# Altium footprint library My Library.PCBLIB: 198 footprints (part 4 of 13)
Each footprint in its own frame and in the unit in brackets; x right, y up, seen from the top. Pads: shape width x height; smd on the part's side, far side on the other; paste and mask are expansions set on the pad; w line width, h text height; cw(c..) or ccw(c..) is an arc to the next point about the centre after c.
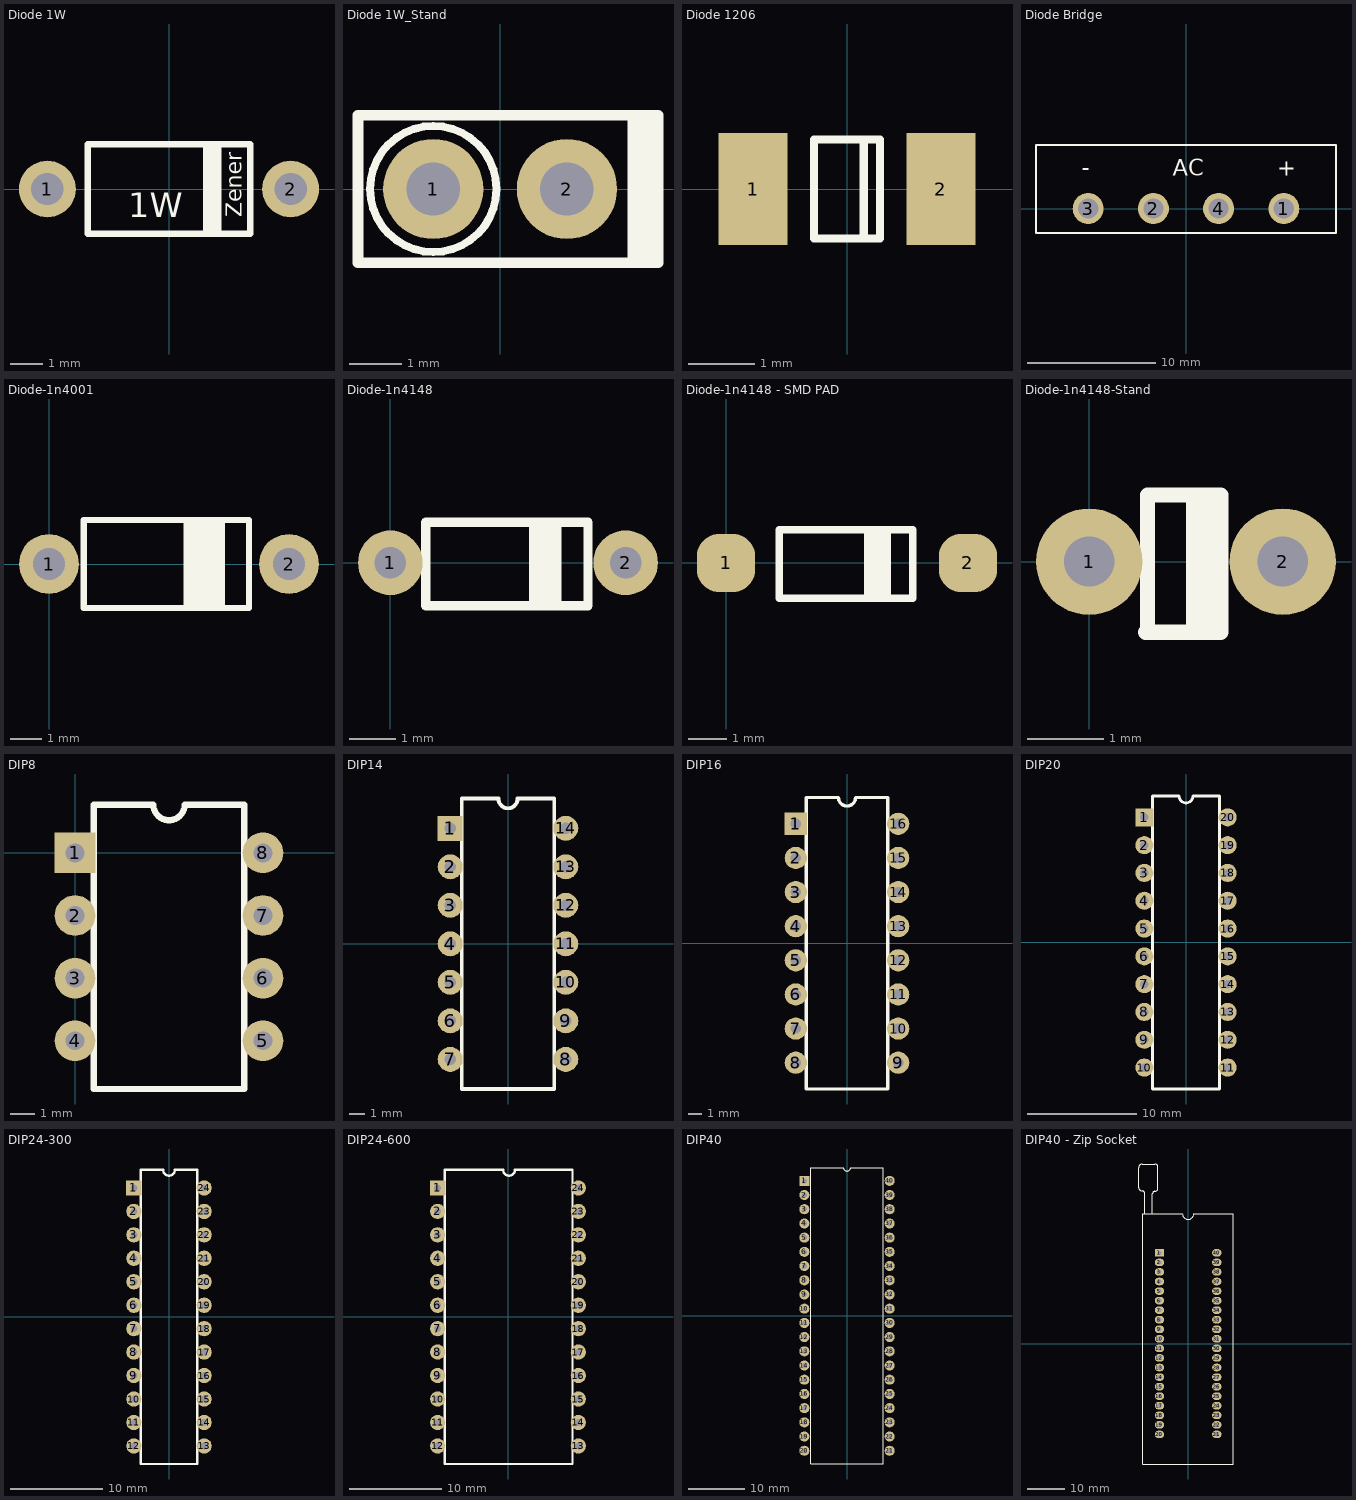
[diagram p3: the footprints below, top view; thin cyan lines are the x and y axes]

## Diode 1W [mil]
height 122.05
pads (2):
  round 70 hole 40: 1(-150,0) 2(150,0)
Top Overlay:
  rectangle: 42,-55 65,55
  lines w7.87: -100,-55 -100,55 100,55 100,-55 -100,-55
  text "1W" at -50,-35 h30
  text "Zener" at 90,-35 h19.68
3D body "Zener 1W.STEP": height 131.24, standoff -39.37, extent -166,-52.5 165,52.5

## Diode 1W_Stand [mil]
pads (2):
  round 75 hole 40: 1(-50,0) 2(50,0)
Top Overlay:
  circle w5.91: c-50,0 r47.24
  rectangle: 95.47,-55 118.11,55
  lines w7.87: -106.3,-55 118.11,-55 118.11,55 -106.3,55 -106.3,-55
3D body "Zener 1W_Stand.STEP": height 291.09, standoff -39.37, extent -103,-52 65,53

## Diode 1206 [mm]
pads (2):
  rect 1.05x1.7 smd: 1(-1.425,0) 2(1.425,0)
Top Overlay:
  lines w0.127: 0.254,-0.75 0.254,0.75 ; -0.5,-0.75 -0.5,0.75 0.5,0.75 0.5,-0.75 -0.5,-0.75

## Diode Bridge [mil]
pads (4):
  round 95 hole 62: 1(300,0) 2(-100,0) 3(-300,0) 4(100,0)
Top Overlay:
  lines w7: -460,-75 460,-75 460,195 -460,195 -460,-75
  text "AC" at -40,100 h50
  text "-" at -320,100 h50
  text "+" at 280,100 h50
3D body "KBU8M.STEP": height 759.84, standoff -157.48, extent -455,-75 458.39,195.08

## Diode-1n4001 [mil]
pads (2):
  round 75 hole 40: 1(0,0) 2(300,0)
Top Overlay:
  rectangle: 167.83,-59.06 220,59.06
  lines w7.87: 43.31,-55 250,-55 250,55 43.31,55 43.31,-55
3D body "1N4007.STEP": height 131.24, standoff -39.37, extent -16,-52.5 315,52.5

## Diode-1n4148 [mil]
pads (2):
  round 55 hole 27: 1(0,0) 2(200,0)
Top Overlay:
  rectangle: 117.72,-36.5 145.28,34.37
  lines w7.87: 30.12,-36.5 30.12,34.37 167.91,34.37 167.91,-36.5 30.12,-36.5
3D body "1N4148.STEP": height 71.22, standoff -40, extent -6.5,-31.96 210.5,33

## Diode-1n4148 - SMD PAD [mil]
pads (2):
  rrect75% 60x60 smd: 1(0,0) 2(250,0)
Top Overlay:
  rectangle: 142.72,-36.5 170.28,34.37
  lines w7.87: 55.12,-36.5 55.12,34.37 192.91,34.37 192.91,-36.5 55.12,-36.5
3D body "1N4148.STEP": height 111.22, standoff 0, extent 16.5,-29.96 233.5,35

## Diode-1n4148-Stand [mil]
pads (2):
  round 55 hole 26: 1(0,0) 2(100,0)
Top Overlay:
  rectangle: 50,-36.87 66,34
  lines w7.87: 29.12,-36.5 67,-36.5 ; 30.12,-36.5 30.12,34.37 68,34.37 68,-36.5
3D body "1N4148_Stand_V2008.STEP": height 216.61, standoff -40, extent -32,-32 108.98,32.96

## DIP8 [mil]
pads (8):
  rect 65x65 hole 30: 1(0,0)
  round 65 hole 30: 2(0,-100) 3(0,-200) 4(0,-300) 5(300,-300) 6(300,-200) 7(300,-100) 8(300,0)
Top Overlay:
  lines w10: 30,-377 270,-377 270,77 175,77 cw(c150,77) 125,77 30,77 30,-377
3D body "SW3DPS-DIP8-DEFAULT.step": height 165, standoff -105, extent -5,-375 305,75

## DIP14 [mil]
pads (14):
  rect 65x65 hole 30: 1(-150,300)
  round 65 hole 30: 2(-150,200) 3(-150,100) 4(-150,0) 5(-150,-100) 6(-150,-200) 7(-150,-300) 8(150,-300) 9(150,-200) 10(150,-100) 11(150,0) 12(150,100) 13(150,200) 14(150,300)
Top Overlay:
  lines w10: -120,-377 -120,377 -25,377 ccw(c0,377) 25,377 120,377 120,-377 -120,-377
3D body "SW3dPS-DIP14-300.step": height 200, standoff -98.03, extent -154.92,-383.86 154.92,383.86

## DIP16 [mil]
pads (16):
  rect 65x65 hole 30: 1(-150,350)
  round 65 hole 30: 2(-150,250) 3(-150,150) 4(-150,50) 5(-150,-50) 6(-150,-150) 7(-150,-250) 8(-150,-350) 9(150,-350) 10(150,-250) 11(150,-150) 12(150,-50) 13(150,50) 14(150,150) 15(150,250) 16(150,350)
Top Overlay:
  lines w10: -120,-427 120,-427 120,427 25,427 cw(c0,427) -25,427 -120,427 -120,-427
3D body "SW3dPS-DIP16-300.step": height 200, standoff -98.03, extent -154.92,-393.7 154.92,393.7

## DIP20 [mil]
pads (20):
  rect 65x65 hole 30: 1(-150,450)
  round 65 hole 30: 2(-150,350) 3(-150,250) 4(-150,150) 5(-150,50) 6(-150,-50) 7(-150,-150) 8(-150,-250) 9(-150,-350) 10(-150,-450) 11(150,-450) 12(150,-350) 13(150,-250) 14(150,-150) 15(150,-50) 16(150,50) 17(150,150) 18(150,250) 19(150,350) 20(150,450)
Top Overlay:
  lines w10: -120,-527 -120,527 -25,527 ccw(c0,527) 25,527 120,527 120,-527 -120,-527
Mechanical 1:
  drawing of 264 lines, arcs and shapes, not listed
3D body: height 101, standoff 100, extent -25.5,501.6 25.5,532.1
3D body: height 35, standoff -75, extent 145,-359 155,-341
3D body: height 75, standoff 35, extent 145,-375 155,-325
3D body: height 75, standoff 65, extent 125,-375 145,-325
3D body: height 35, standoff -75, extent 145,-459 155,-441
3D body: height 75, standoff 35, extent 145,-475 155,-425
3D body: height 75, standoff 65, extent 125,-475 145,-425
3D body: height 35, standoff -75, extent -155,-459 -145,-441
3D body: height 75, standoff 35, extent -155,-475 -145,-425
3D body: height 75, standoff 65, extent -145,-475 -125,-425
3D body: height 35, standoff -75, extent -155,-359 -145,-341
3D body: height 75, standoff 35, extent -155,-375 -145,-325
3D body: height 75, standoff 65, extent -145,-375 -125,-325
3D body: height 75, standoff 65, extent 124,-275 144,-225
3D body: height 75, standoff 35, extent 144,-275 154,-225
3D body: height 35, standoff -75, extent 144,-259 154,-241
3D body: height 75, standoff 65, extent -145,-275 -125,-225
3D body: height 75, standoff 35, extent -155,-275 -145,-225
3D body: height 35, standoff -75, extent -155,-259 -145,-241
3D body: height 35, standoff -75, extent 145,441 155,459
3D body: height 75, standoff 35, extent 145,425 155,475
3D body: height 75, standoff 65, extent 125,425 145,475
3D body: height 35, standoff -75, extent 145,341 155,359
3D body: height 75, standoff 35, extent 145,325 155,375
3D body: height 75, standoff 65, extent 125,325 145,375
3D body: height 35, standoff -75, extent 145,241 155,259
3D body: height 75, standoff 35, extent 145,225 155,275
3D body: height 75, standoff 65, extent 125,225 145,275
3D body: height 35, standoff -75, extent 145,141 155,159
3D body: height 75, standoff 35, extent 145,125 155,175
3D body: height 75, standoff 65, extent 125,125 145,175
3D body: height 35, standoff -75, extent 145,41 155,59
3D body: height 75, standoff 35, extent 145,25 155,75
3D body: height 75, standoff 65, extent 125,25 145,75
3D body: height 35, standoff -75, extent 145,-59 155,-41
3D body: height 75, standoff 35, extent 145,-75 155,-25
3D body: height 75, standoff 65, extent 125,-75 145,-25
3D body: height 35, standoff -75, extent 145,-159 155,-141
3D body: height 75, standoff 35, extent 145,-175 155,-125
3D body: height 75, standoff 65, extent 125,-175 145,-125
3D body: height 35, standoff -75, extent -155,-159 -145,-141
3D body: height 75, standoff 35, extent -155,-175 -145,-125
3D body: height 75, standoff 65, extent -145,-175 -125,-125
3D body: height 35, standoff -75, extent -155,-59 -145,-41
3D body: height 75, standoff 35, extent -155,-75 -145,-25
3D body: height 75, standoff 65, extent -145,-75 -125,-25
3D body: height 35, standoff -75, extent -155,41 -145,59
3D body: height 75, standoff 35, extent -155,25 -145,75
3D body: height 75, standoff 65, extent -145,25 -125,75
3D body: height 35, standoff -75, extent -155,141 -145,159
3D body: height 75, standoff 35, extent -155,125 -145,175
3D body: height 75, standoff 65, extent -145,125 -125,175
3D body: height 35, standoff -75, extent -155,241 -145,259
3D body: height 75, standoff 35, extent -155,225 -145,275
3D body: height 75, standoff 65, extent -145,225 -125,275
3D body: height 35, standoff -75, extent -155,341 -145,359
3D body: height 75, standoff 35, extent -155,325 -145,375
3D body: height 75, standoff 65, extent -145,325 -125,375
3D body: height 115, standoff 100, extent -125,-527 125,532
3D body: height 100, standoff 30, extent -125,-527 125,532
3D body: height 75, standoff 65, extent -145,425 -125,475
3D body: height 75, standoff 35, extent -155,425 -145,475
3D body: height 35, standoff -75, extent -155,441 -145,459

## DIP24-300 [mil]
pads (24):
  rect 65x65 hole 30: 1(-150,550)
  round 65 hole 30: 2(-150,450) 3(-150,350) 4(-150,250) 5(-150,150) 6(-150,50) 7(-150,-50) 8(-150,-150) 9(-150,-250) 10(-150,-350) 11(-150,-450) 12(-150,-550) 13(150,-550) 14(150,-450) 15(150,-350) 16(150,-250) 17(150,-150) 18(150,-50) 19(150,50) 20(150,150) 21(150,250) 22(150,350) 23(150,450) 24(150,550)
Top Overlay:
  lines w10: -120,-627 120,-627 120,627 25,627 cw(c0,627) -25,627 -120,627 -120,-627
3D body "SW3dPS-DIP24-300.step": height 200, standoff -98.03, extent -154.92,-635.04 154.92,635.04

## DIP24-600 [mil]
pads (24):
  rect 65x65 hole 30: 1(-300,550)
  round 65 hole 30: 2(-300,450) 3(-300,350) 4(-300,250) 5(-300,150) 6(-300,50) 7(-300,-50) 8(-300,-150) 9(-300,-250) 10(-300,-350) 11(-300,-450) 12(-300,-550) 13(300,-550) 14(300,-450) 15(300,-350) 16(300,-250) 17(300,-150) 18(300,-50) 19(300,50) 20(300,150) 21(300,250) 22(300,350) 23(300,450) 24(300,550)
Top Overlay:
  lines w10: -21.47,627 -270,627 -270,-627 275,-627 275,627 29.47,627 cw(c4.47,626.98) -20.53,626.98
3D body "SW3dPS-DIP24-600.step": height 224.41, standoff -101.57, extent -304.92,-635.04 304.92,635.04

## DIP40 [mm]
pads (40):
  rect 1.8x1.8 hole 0.9: 1(-7.62,24.13)
  round 1.8 hole 0.9: 2(-7.62,21.59) 3(-7.62,19.05) 4(-7.62,16.51) 5(-7.62,13.97) 6(-7.62,11.43) 7(-7.62,8.89) 8(-7.62,6.35) 9(-7.62,3.81) 10(-7.62,1.27) 11(-7.62,-1.27) 12(-7.62,-3.81) 13(-7.62,-6.35) 14(-7.62,-8.89) 15(-7.62,-11.43) 16(-7.62,-13.97) 17(-7.62,-16.51) 18(-7.62,-19.05) 19(-7.62,-21.59) 20(-7.62,-24.13) 21(7.62,-24.13) 22(7.62,-21.59) 23(7.62,-19.05) 24(7.62,-16.51) 25(7.62,-13.97) 26(7.62,-11.43) 27(7.62,-8.89) 28(7.62,-6.35) 29(7.62,-3.81) 30(7.62,-1.27) 31(7.62,1.27) 32(7.62,3.81) 33(7.62,6.35) 34(7.62,8.89) 35(7.62,11.43) 36(7.62,13.97) 37(7.62,16.51) 38(7.62,19.05) 39(7.62,21.59) 40(7.62,24.13)
Top Overlay:
  lines w0.2: -6.45,-26.5 -6.45,26.5 -0.635,26.5 ccw(c0,26.5) 0.635,26.5 6.45,26.5 6.45,-26.5 -6.45,-26.5
3D body "SW3dPS-DIP40-600.step": height 5.7, standoff -2.58, extent -7.745,-26.225 7.745,26.225

## DIP40 - Zip Socket [mm]
pads (40):
  rect 2.5x2 hole 1.1: 1(-7.62,24.13)
  oval 2.5x2 hole 1.1: 2(-7.62,21.59) 3(-7.62,19.05) 4(-7.62,16.51) 5(-7.62,13.97) 6(-7.62,11.43) 7(-7.62,8.89) 8(-7.62,6.35) 9(-7.62,3.81) 10(-7.62,1.27) 11(-7.62,-1.27) 12(-7.62,-3.81) 13(-7.62,-6.35) 14(-7.62,-8.89) 15(-7.62,-11.43) 16(-7.62,-13.97) 17(-7.62,-16.51) 18(-7.62,-19.05) 19(-7.62,-21.59) 20(-7.62,-24.13) 21(7.62,-24.13) 22(7.62,-21.59) 23(7.62,-19.05) 24(7.62,-16.51) 25(7.62,-13.97) 26(7.62,-11.43) 27(7.62,-8.89) 28(7.62,-6.35) 29(7.62,-3.81) 30(7.62,-1.27) 31(7.62,1.27) 32(7.62,3.81) 33(7.62,6.35) 34(7.62,8.89) 35(7.62,11.43) 36(7.62,13.97) 37(7.62,16.51) 38(7.62,19.05) 39(7.62,21.59) 40(7.62,24.13)
Top Overlay:
  lines w0.2: -11.557,34.5 -11.557,39.903 ccw(c-12.243,39.903) -12.243,40.589 cw(c-12.243,41.478) -13.132,41.478 -13.132,46.812 cw(c-12.198,46.812) -12.198,47.746 -8.808,47.746 cw(c-8.808,46.965) -8.026,46.965 -8.026,41.269 cw(c-8.808,41.269) -8.808,40.488 ccw(c-8.808,39.795) -9.5,39.795 -9.5,34.5 ; -12,-32 12,-32 12,34.5 1.5,34.5 cw(c0,34.5) -1.5,34.5 -12,34.5 -12,-32
3D body "Zif-Zip Socket.STEP": height 21.95, standoff -2.53, extent -12.975,-31.475 11.501,41.579